# Altium footprint library Project_Vega.PcbLib: 57 footprints (part 2 of 4)
Each footprint in its own frame and in the unit in brackets; x right, y up, seen from the top. Pads: shape width x height; smd on the part's side, far side on the other; paste and mask are expansions set on the pad; w line width, h text height; cw(c..) or ccw(c..) is an arc to the next point about the centre after c.
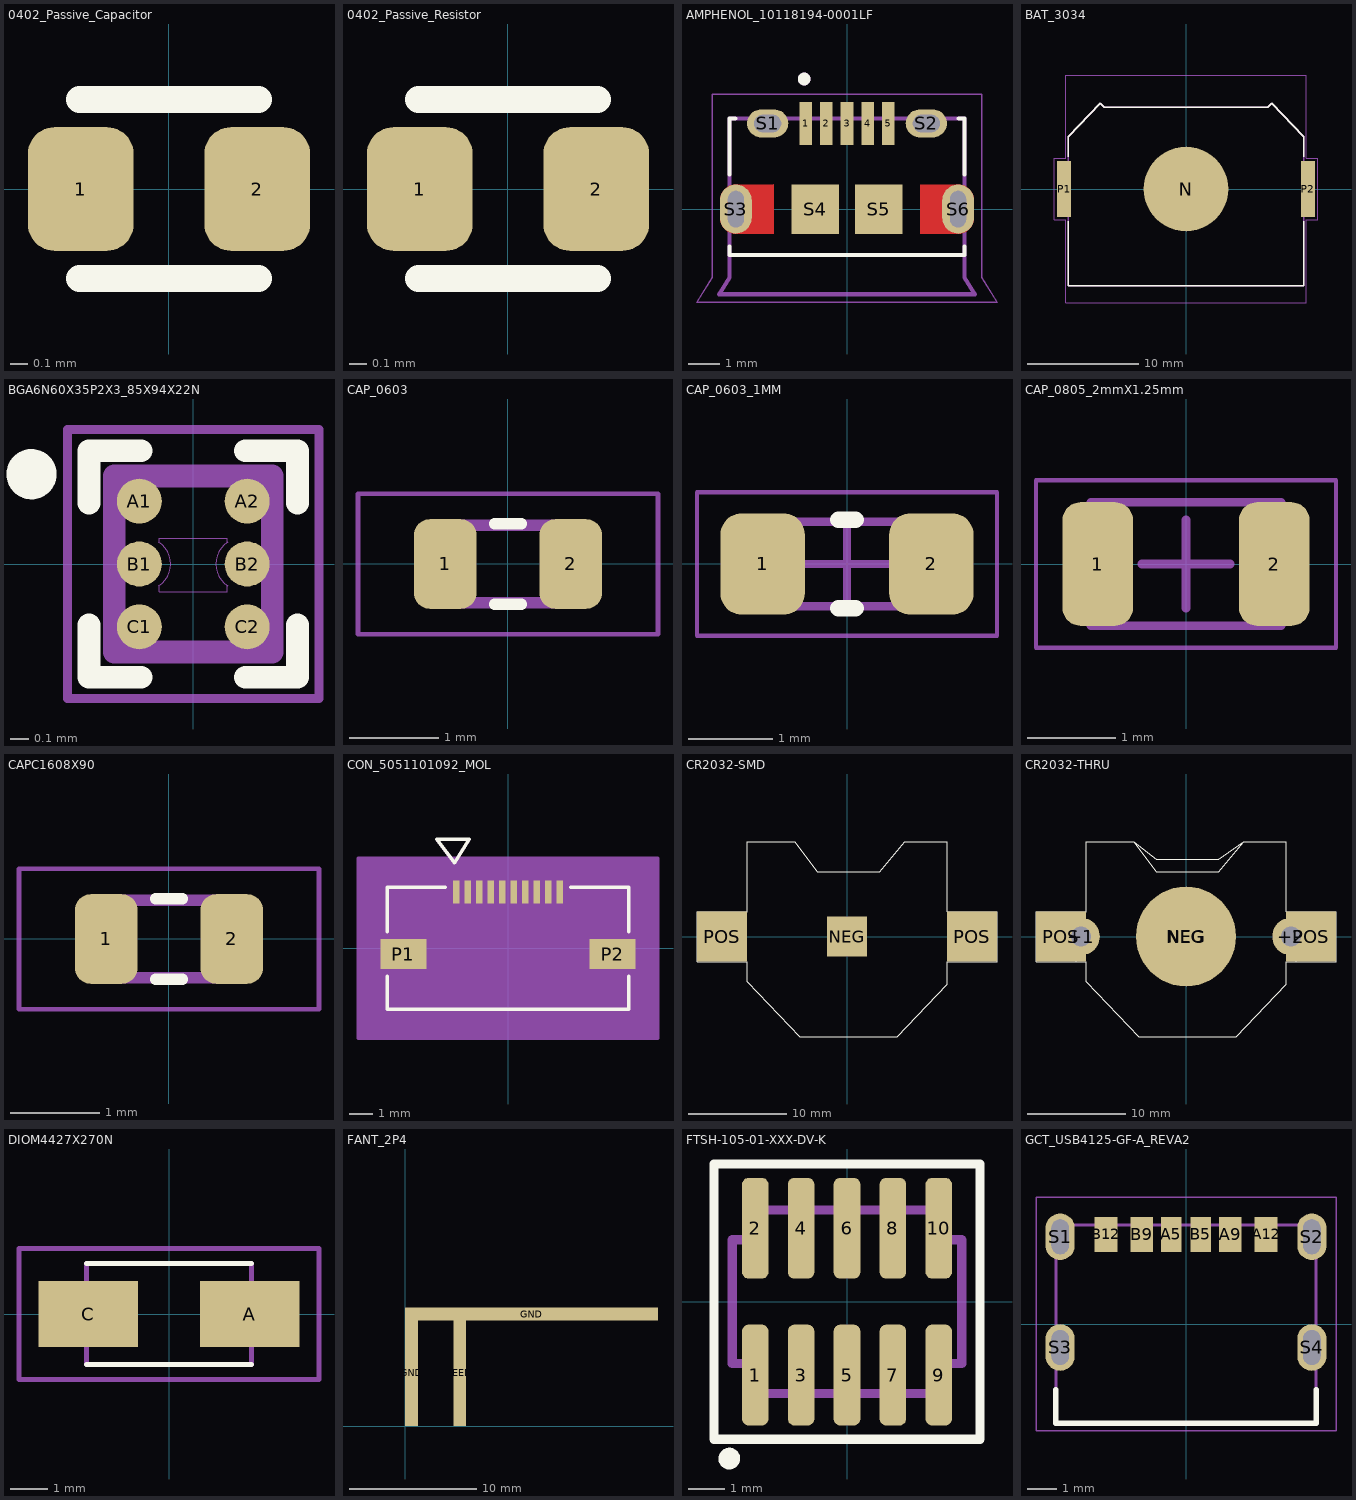
[diagram p1: the footprints below, top view; thin cyan lines are the x and y axes]

## 0402_Passive_Capacitor [mm] "Reference: https://www.worthingtonassembly.com/perfect-0402-footprint"
pads (2):
  rrect50% 0.6x0.7 smd mask+0: 1(-0.5,0) 2(0.5,0)
Top Overlay:
  lines w0.152: -0.508,-0.508 0.508,-0.508 ; -0.508,0.508 0.508,0.508
Mechanical 13:
  text ".Designator" at 0.051,0.22 h0.51
3D body "Capacitor_1005.STEP": height 0.5, standoff 0, extent -0.5,-0.275 0.5,0.275

## 0402_Passive_Resistor [mm] "Reference: https://www.worthingtonassembly.com/perfect-0402-footprint"
pads (2):
  rrect50% 0.6x0.7 smd mask+0: 1(-0.5,0) 2(0.5,0)
Top Overlay:
  lines w0.152: -0.508,-0.508 0.508,-0.508 ; -0.508,0.508 0.508,0.508
Mechanical 13:
  text ".Designator" at 0.025,0.195 h0.51
3D body "Res_0402.STEP": height 0.4, standoff 0, extent -0.492,-0.25 0.508,0.25

## AMPHENOL_10118194-0001LF [mm]
pads (11):
  rect 0.4x1.35 smd mask+0.051: 1(-1.3,2.7) 2(-0.65,2.7) 3(0,2.7) 4(0.65,2.7) 5(1.3,2.7)
  oval 1.3x0.889 hole 0.55 slot 0.85 at 0 deg mask+0.102: S1(-2.5,2.7) S2(2.5,2.7)
  oval 1.003x1.55 hole 0.5 slot 1.15 at 90 deg: S3(-3.5,0) S6(3.5,0)
  rect 1.5x1.55 smd: S4(-1,0) S5(1,0)
Top Layer:
  region: 192 vertices and 0 holes, not listed, extent 2.3,-0.78 4,0.775
  region: 192 vertices and 0 holes, not listed, extent -4,-0.775 -2.3,0.78
Top Overlay:
  circle w0.2: c-1.35,4.1 r0.1
  lines w0.127: -3.7,-1.18 -3.7,-1.45 3.7,-1.45 3.7,-1.18 ; -3.7,1.095 -3.7,2.85 -3.52,2.85 ; 3.52,2.85 3.7,2.85 3.7,1.095
Top Paste:
  drawing of 6 lines, arcs and shapes, not listed
Top Solder:
  region: 3.626,0.874 3.652,0.872 3.678,0.869 3.704,0.864 3.729,0.858 3.755,0.851 3.779,0.842 3.803,0.832 3.827,0.821 3.85,0.808 3.872,0.794 3.894,0.78 3.915,0.764 3.935,0.747 3.954,0.729 3.972,0.71 3.989,0.69 4.005,0.669 4.019,0.647 4.033,0.625 4.046,0.602 4.057,0.578 4.067,0.554 4.076,0.53 4.083,0.504 4.089,0.479 4.094,0.453 4.097,0.427 4.099,0.401 4.1,0.375 4.1,-0.375 4.099,-0.401 4.097,-0.427 4.094,-0.453 4.089,-0.479 4.083,-0.504 4.076,-0.53 4.067,-0.554 4.057,-0.578 4.046,-0.602 4.033,-0.625 4.019,-0.647 4.005,-0.669 3.989,-0.69 3.972,-0.71 3.954,-0.729 3.935,-0.747 3.915,-0.764 3.894,-0.78 3.872,-0.794 3.85,-0.808 3.827,-0.821 3.803,-0.832 3.779,-0.842 3.755,-0.851 3.729,-0.858 3.704,-0.864 3.678,-0.869 3.652,-0.872 3.626,-0.874 3.6,-0.875 2.2,-0.875 2.2,0.875 3.6,0.875
  region: -2.2,-0.875 -3.6,-0.875 -3.626,-0.874 -3.652,-0.872 -3.678,-0.869 -3.704,-0.864 -3.729,-0.858 -3.755,-0.851 -3.779,-0.842 -3.803,-0.832 -3.827,-0.821 -3.85,-0.808 -3.872,-0.794 -3.894,-0.78 -3.915,-0.764 -3.935,-0.747 -3.954,-0.729 -3.972,-0.71 -3.989,-0.69 -4.005,-0.669 -4.019,-0.647 -4.033,-0.625 -4.046,-0.602 -4.057,-0.578 -4.067,-0.554 -4.076,-0.53 -4.083,-0.504 -4.089,-0.479 -4.094,-0.453 -4.097,-0.427 -4.099,-0.401 -4.1,-0.375 -4.1,0.375 -4.099,0.401 -4.097,0.427 -4.094,0.453 -4.089,0.479 -4.083,0.504 -4.076,0.53 -4.067,0.554 -4.057,0.578 -4.046,0.602 -4.033,0.625 -4.019,0.647 -4.005,0.669 -3.989,0.69 -3.972,0.71 -3.954,0.729 -3.935,0.747 -3.915,0.764 -3.894,0.78 -3.872,0.794 -3.85,0.808 -3.827,0.821 -3.803,0.832 -3.779,0.842 -3.755,0.851 -3.729,0.858 -3.704,0.864 -3.678,0.869 -3.652,0.872 -3.626,0.874 -3.6,0.875 -2.2,0.875
Mechanical 13:
  circle w0.2: c-1.35,4.1 r0.1
  lines w0.127: -3.7,-1.45 -3.7,-2.15 -4.025,-2.68 4.025,-2.68 3.7,-2.15 3.7,-1.45 ; -3.7,-1.45 -3.7,2.85 3.7,2.85 3.7,-1.45 ; -3.7,-1.45 3.7,-1.45
  text ".Designator" at -3.187,1.219 h0.5
  text "PCB END" at -1.95,-2.1 h0.5
Mechanical 15:
  lines w0.05: -4.725,-2.93 -4.25,-2.15 -4.25,3.625 4.25,3.625 4.25,-2.15 4.725,-2.93 -4.725,-2.93
3D body "10118194-0001LF--3DModel-STEP-533217COLOR.STEP": height 2.69, standoff -0.58, extent -4.025,-2.667 4.025,2.913

## BAT_3034 [mm]
height 4.31
pads (3):
  round 7.62 smd paste-3: N(0,0)
  rect 1.27x5.08 smd: P1(-10.985,0) P2(10.985,0)
Top Overlay:
  lines w0.127: -10.605,-2.9 -10.605,-8.729 10.605,-8.729 10.605,-2.9 ; -10.605,2.9 -10.605,4.723 -7.734,7.741 -7.366,7.391 7.366,7.391 7.734,7.741 10.605,4.723 10.605,2.9
Mechanical 13:
  lines w0.127: -10.605,-8.729 10.605,-8.729 10.605,4.723 7.734,7.741 7.366,7.391 -7.366,7.391 -7.734,7.741 -10.605,4.723 -10.605,-8.729
  text ".Designator" at -7.112,-6.122 h1.52
Mechanical 15:
  lines w0.05: -11.87,-2.79 -10.855,-2.79 -10.855,-10.25 10.855,-10.25 10.855,-2.79 11.87,-2.79 11.87,2.79 10.855,2.79 10.855,10.25 -10.855,10.25 -10.855,2.79 -11.87,2.79 -11.87,-2.79
3D body "3034--3DModel-STEP-630548.STEP": height 4.06, standoff 0, extent -11.62,-8.76 11.62,7.716

## BGA6N60X35P2X3_85X94X22N [mm]
pads (6):
  round 0.25 smd paste-1 mask-0.05: A1(-0.3,0.35) A2(0.3,0.35) B1(-0.3,0) B2(0.3,0) C1(-0.3,-0.35) C2(0.3,-0.35)
Top Overlay:
  circle w0.14: c-0.9,0.5 r0.07
  lines w0.127: -0.58,-0.34 -0.58,-0.63 -0.29,-0.63 ; -0.58,0.34 -0.58,0.63 -0.29,0.63 ; 0.29,-0.63 0.58,-0.63 0.58,-0.34 ; 0.29,0.63 0.58,0.63 0.58,0.34
Top Paste:
  drawing of 6 lines, arcs and shapes, not listed
Mechanical 1:
  lines w0: -0.192,-0.121 ccw(c-0.267,0) -0.192,0.121 ; -0.191,-0.12 -0.191,-0.154 0.191,-0.154 0.191,-0.12 ; -0.191,0.12 -0.191,0.144 0.191,0.144 0.191,0.12 ; 0.192,-0.121 cw(c0.267,0) 0.192,0.121
Mechanical 13:
  lines w0.127: -0.44,-0.49 0.44,-0.49 0.44,0.49 -0.44,0.49 -0.44,-0.49
  text ".Designator" at -0.075,-0.399 h0.15
Mechanical 15:
  lines w0.05: -0.7,-0.75 0.7,-0.75 0.7,0.75 -0.7,0.75 -0.7,-0.75
3D body "step_temp.STEP": height 0.22, standoff -0.01, extent -0.428,-0.473 0.428,0.473

## CAP_0603 [mm] "Ceramic Capacitor 0603"
pads (2):
  rrect50% 0.7x1 smd: 1(-0.7,0) 2(0.7,0)
Top Overlay:
  lines w0.127: -0.15,-0.45 0.15,-0.45 ; -0.15,0.45 0.15,0.45
Mechanical 13:
  lines w0.127: -0.838,-0.432 0.838,-0.432 0.838,0.432 -0.838,0.432 -0.838,-0.419
  text ".Designator" at -0.048,-0.179 h0.51
Mechanical 15:
  lines w0.051: -1.673,-0.783 -1.673,0.783 1.673,0.783 1.673,-0.783 -1.673,-0.783
3D body "step_temp.STEP": height 0.9, standoff 0, extent -0.8,-0.4 0.8,0.4

## CAP_0603_1MM [mm] "Chip Capacitor, 2-Leads, Body 1.60x0.80mm, IPC Medium Density"
height 1
pads (2):
  rrect50% 1x1.2 smd: 1(-1,0) 2(1,0)
Top Overlay:
  lines w0.2: -0.1,-0.525 0.1,-0.525 ; -0.1,0.525 0.1,0.525
Mechanical 13:
  lines w0.1: -0.9,-0.5 0.9,-0.5 0.9,0.5 -0.9,0.5 -0.9,-0.5
  text ".Designator" at -0.723,-0.254 h0.5
Mechanical 15:
  lines w0.05: -1.778,-0.85 1.778,-0.85 1.778,0.85 -1.778,0.85 -1.778,-0.85
  lines w0.1: -0.5,0 0.5,0 ; 0,-0.5 0,0.5
3D body "CAP_0603_1608X10.step": height 1, standoff 0, extent -0.9,-0.5 0.9,0.5

## CAP_0805_2mmX1.25mm [mm]
height 1.4
pads (2):
  rrect50% 0.8x1.4 smd: 1(-1,0) 2(1,0)
Mechanical 13:
  lines w0.1: -1.075,-0.7 1.075,-0.7 1.075,0.7 -1.075,0.7 -1.075,-0.7
  text ".Designator" at -0.82,-0.42 h0.9
Mechanical 15:
  lines w0.05: -1.7,-0.95 1.7,-0.95 1.7,0.95 -1.7,0.95 -1.7,-0.95
  lines w0.1: -0.5,0 0.5,0 ; 0,-0.5 0,0.5
3D body "GRM21BR61E106KA73K.step": height 1.23, standoff -0.02, extent -1,-0.7 1,0.7

## CAPC1608X90 [mm]
pads (2):
  rrect50% 0.7x1 smd: 1(-0.7,0) 2(0.7,0)
Top Overlay:
  lines w0.127: -0.15,-0.45 0.15,-0.45 ; -0.15,0.45 0.15,0.45
Mechanical 13:
  lines w0.127: -0.838,-0.432 0.838,-0.432 0.838,0.432 -0.838,0.432 -0.838,-0.419
  text ".Designator" at -0.61,-0.178 h0.15
Mechanical 15:
  lines w0.051: -1.673,-0.783 1.673,-0.783 1.673,0.783 -1.673,0.783 -1.673,-0.783
3D body "step_temp.STEP": height 0.9, standoff 0, extent -0.8,-0.4 0.8,0.4

## CON_5051101092_MOL [mm] "10 Position FFC, FPC Connector Contacts, Bottom 0.020\" (0.50mm) Surface Mount, Right Angle"
pads (12):
  rect 0.3x1 smd paste+0 mask+0.025: 1(-2.25,2.45) 2(-1.75,2.45) 3(-1.25,2.45) 4(-0.75,2.45) 5(-0.25,2.45) 6(0.25,2.45) 7(0.75,2.45) 8(1.25,2.45) 9(1.75,2.45) 10(2.25,2.45)
  rect 2x1.3 smd paste+0 mask+0.025: P1(-4.55,-0.25) P2(4.55,-0.25)
Top Overlay:
  lines w0.152: -5.25,-1.22 -5.25,-2.65 5.25,-2.65 5.25,-1.22 ; -5.25,0.72 -5.25,2.65 -2.72,2.65 ; 2.72,2.65 5.25,2.65 5.25,0.72 ; -3.091,4.736 -1.694,4.736 -2.329,3.72 -3.091,4.736
Mechanical 13:
  lines w0.127: -5.25,-2.65 5.25,-2.65 5.25,2.65 -5.25,2.65 -5.25,-2.65 ; -3.091,4.736 -1.694,4.736 -2.329,3.72 -3.091,4.736
  text ".Designator" at -4.572,-2.159 h1.27
Mechanical 15:
  region: 6.52,3.92 -6.52,3.92 -6.52,-3.92 6.52,-3.92
  pour cut-out: 6.52,3.92 -6.52,3.92 -6.52,-3.92 6.52,-3.92
  lines w0.127: -6.52,-3.92 -6.52,3.92 ; -6.52,-3.92 6.52,-3.92 ; -6.52,-3.92 -6.52,3.92 ; -6.52,-3.92 6.52,-3.92 ; -6.52,3.92 6.52,3.92 ; -6.52,3.92 6.52,3.92 ; 6.52,-3.92 6.52,3.92 ; 6.52,-3.92 6.52,3.92
3D body "5051101092.stp": height 1.88, standoff -0.02, extent -5.25,-2.724 5.25,2.576

## CR2032-SMD [mil]
pads (3):
  rect 160x160 smd: NEG(0,0)
  rect 200x200 smd: POS(-500,0) POS(500,0)
Top Overlay:
  circle w5: c-510,0 r36.06
  circle w5: c500,10 r36.06
  lines w5: -600,-100 -400,-100 -400,-180 -190,-400 200,-400 400,-190 400,-100 600,-100 600,100 400,100 400,380 230,380 130,260 -120,260 -210,380 -400,380 -400,100 -600,100 -600,-100
Top Solder:
  region: 18.54,353.85 37.04,352.39 55.43,349.97 73.67,346.59 91.71,342.26 109.49,336.99 126.98,330.8 144.12,323.7 160.86,315.71 177.17,306.86 192.98,297.17 208.27,286.66 222.99,275.37 237.09,263.32 250.55,250.55 263.32,237.09 275.37,222.99 286.66,208.27 297.17,192.98 306.86,177.17 315.71,160.86 323.7,144.12 330.8,126.98 336.99,109.49 342.26,91.71 346.59,73.67 349.97,55.43 352.39,37.04 353.85,18.54 354.33,0 353.85,-18.54 352.39,-37.04 349.97,-55.43 346.59,-73.67 342.26,-91.71 336.99,-109.49 330.8,-126.98 323.7,-144.12 315.71,-160.86 306.86,-177.17 297.17,-192.98 286.66,-208.27 275.37,-222.99 263.32,-237.09 250.55,-250.55 237.09,-263.32 222.99,-275.37 208.27,-286.66 192.98,-297.17 177.17,-306.86 160.86,-315.71 144.12,-323.7 126.98,-330.8 109.49,-336.99 91.71,-342.26 73.67,-346.59 55.43,-349.97 37.04,-352.39 18.54,-353.85 0,-354.33 -18.54,-353.85 -37.04,-352.39 -55.43,-349.97 -73.67,-346.59 -91.71,-342.26 -109.49,-336.99 -126.98,-330.8 -144.12,-323.7 -160.86,-315.71 -177.17,-306.86 -192.98,-297.17 -208.27,-286.66 -222.99,-275.37 -237.09,-263.32 -250.55,-250.55 -263.32,-237.09 -275.37,-222.99 -286.66,-208.27 -297.17,-192.98 -306.86,-177.17 -315.71,-160.86 -323.7,-144.12 -330.8,-126.98 -336.99,-109.49 -342.26,-91.71 -346.59,-73.67 -349.97,-55.43 -352.39,-37.04 -353.85,-18.54 -354.33,0 -353.85,18.54 -352.39,37.04 -349.97,55.43 -346.59,73.67 -342.26,91.71 -336.99,109.49 -330.8,126.98 -323.7,144.12 -315.71,160.86 -306.86,177.17 -297.17,192.98 -286.66,208.27 -275.37,222.99 -263.32,237.09 -250.55,250.55 -237.09,263.32 -222.99,275.37 -208.27,286.66 -192.98,297.17 -177.17,306.86 -160.86,315.71 -144.12,323.7 -126.98,330.8 -109.49,336.99 -91.71,342.26 -73.67,346.59 -55.43,349.97 -37.04,352.39 -18.54,353.85 0,354.33
Mechanical 1:
  text ".Designator" at -139,-379 h30
3D body "CR2032--3DModel-STEP-56544.STEP": height 125.98, standoff 0, extent -393.7,-393.7 393.7,393.7

## CR2032-THRU [mil]
pads (6):
  round 150 hole 78.74: +1(-420,0) +2(420,0)
  round 400 smd: NEG(0,0)
  rect 160x160 smd: NEG(0,0)
  rect 200x200 smd: POS(-500,0) POS(500,0)
Top Overlay:
  circle w5: c500,10 r36.06
  circle w5: c-510,0 r36.06
  lines w5: -400,-180 -190,-400 ; -400,-180 -400,-100 ; -400,-180 -190,-400 ; -400,-180 -400,-100 ; -400,-100 -440,-100 -440,100 -400,100 ; -400,-100 -600,-100 -600,100 -400,100 ; -400,100 -400,380 ; -400,100 -400,380 ; -400,380 -210,380 ; -400,380 -210,380 ; -210,380 -120,310 130,310 230,380 ; -210,380 -120,260 130,260 230,380 ; -190,-400 200,-400 ; -190,-400 200,-400 ; 200,-400 400,-190 ; 200,-400 400,-190 ; 230,380 400,380 ; 230,380 400,380 ; 400,-190 400,-100 ; 400,-190 400,-100 ; 400,-100 440,-100 440,100 400,100 ; 400,-100 600,-100 600,100 400,100 ; 400,100 400,380 ; 400,100 400,380
Top Solder:
  drawing of 2 lines, arcs and shapes, not listed
Mechanical 1:
  text ".Designator" at -130,-375 h60
3D body "CR2032--3DModel-STEP-56544.STEP": height 125.98, standoff 0, extent -393.7,-393.7 393.7,393.7

## DIOM4427X270N [mm]
pads (2):
  rect 2.65x1.75 smd: A(2.15,0) C(-2.15,0)
Top Overlay:
  lines w0.127: -2.2,-1.35 2.2,-1.35 ; -2.2,1.35 2.2,1.35
Mechanical 13:
  lines w0.127: -2.2,-1.35 -2.2,1.35 ; 2.2,-1.35 2.2,1.35
  text ".Designator" at -0.254,-0.381 h1.52
Mechanical 15:
  lines w0.127: -4,-1.75 -4,1.75 4,1.75 4,-1.75 -4,-1.75
3D body "step_temp.STEP": height 2.71, standoff 0.01, extent -2.6,-1.362 2.6,1.362

## FANT_2P4 [mil]
pads (3):
  rect 40x331 smd paste-1000 mask+4: FEED(169,165.5) GND(20,165.5)
  rect 782x39 smd paste-1000 mask+4: GND(391,346.5)

## FTSH-105-01-XXX-DV-K [mil]
pads (10):
  rrect50% 29x110 smd mask+2: 1(-100,-80) 2(-100,80) 3(-50,-80) 4(-50,80) 5(0,-80) 6(0,80) 7(50,-80) 8(50,80) 9(100,-80) 10(100,80)
Top Overlay:
  lines w10: -145,-150 145,-150 145,150 -145,150 -145,-150
  lines w11.81: -122.39,-171.52 cw(c-128.27,-171.01) -122.37,-171.01
Mechanical 1:
  lines w10: -125,-67.5 -100,-67.5 -100,-100 100,-100 100,-67.5 125,-67.5 125,67.5 100,67.5 100,100 -100,100 -100,67.5 -125,67.5 -125,-67.5
  text ".Designator" at -97.68,-8.48 h19.68
3D body "FTSH-105-01-LM-DV-K.stp": height 240.75, standoff -0.25, extent -124.99,-114.99 125,115

## GCT_USB4125-GF-A_REVA2 [mm]
pads (10):
  rect 0.7x1.2 smd mask+0.051: A5(-0.5,3.08) B5(0.5,3.08)
  rect 0.76x1.2 smd mask+0.051: A9(1.52,3.08) B9(-1.52,3.08)
  rect 0.8x1.2 smd mask+0.051: A12(2.75,3.08) B12(-2.75,3.08)
  oval 1x1.6 hole 0.6 slot 1.2 at 90 deg mask+0: S1(-4.32,3) S2(4.32,3) S3(-4.32,-0.8) S4(4.32,-0.8)
Top Overlay:
  lines w0.2: -4.47,-2.25 -4.47,-3.4 4.47,-3.4 4.47,-2.25
Top Solder:
  drawing of 4 lines, arcs and shapes, not listed
Bottom Solder:
  drawing of 4 lines, arcs and shapes, not listed
Mechanical 1:
  text ".Designator" at -3.322,-2.363 h0.5
Mechanical 13:
  lines w0.1: -4.47,-3.4 4.47,-3.4 4.47,3.4 -4.47,3.4 -4.47,-3.4
Mechanical 15:
  lines w0.05: -5.15,-3.65 5.15,-3.65 5.15,4.35 -5.15,4.35 -5.15,-3.65
3D body "USB4125-GF-A--3DModel-STEP-56544.STEP": height 3.26, standoff -1.25, extent -4.47,-3.45 4.47,3.45